# Altium footprint library XU-GENARAL PCB .PcbLib: 1176 footprints (part 52 of 75)
Each footprint in its own frame and in the unit in brackets; x right, y up, seen from the top. Pads: shape width x height; smd on the part's side, far side on the other; paste and mask are expansions set on the pad; w line width, h text height; cw(c..) or ccw(c..) is an arc to the next point about the centre after c.
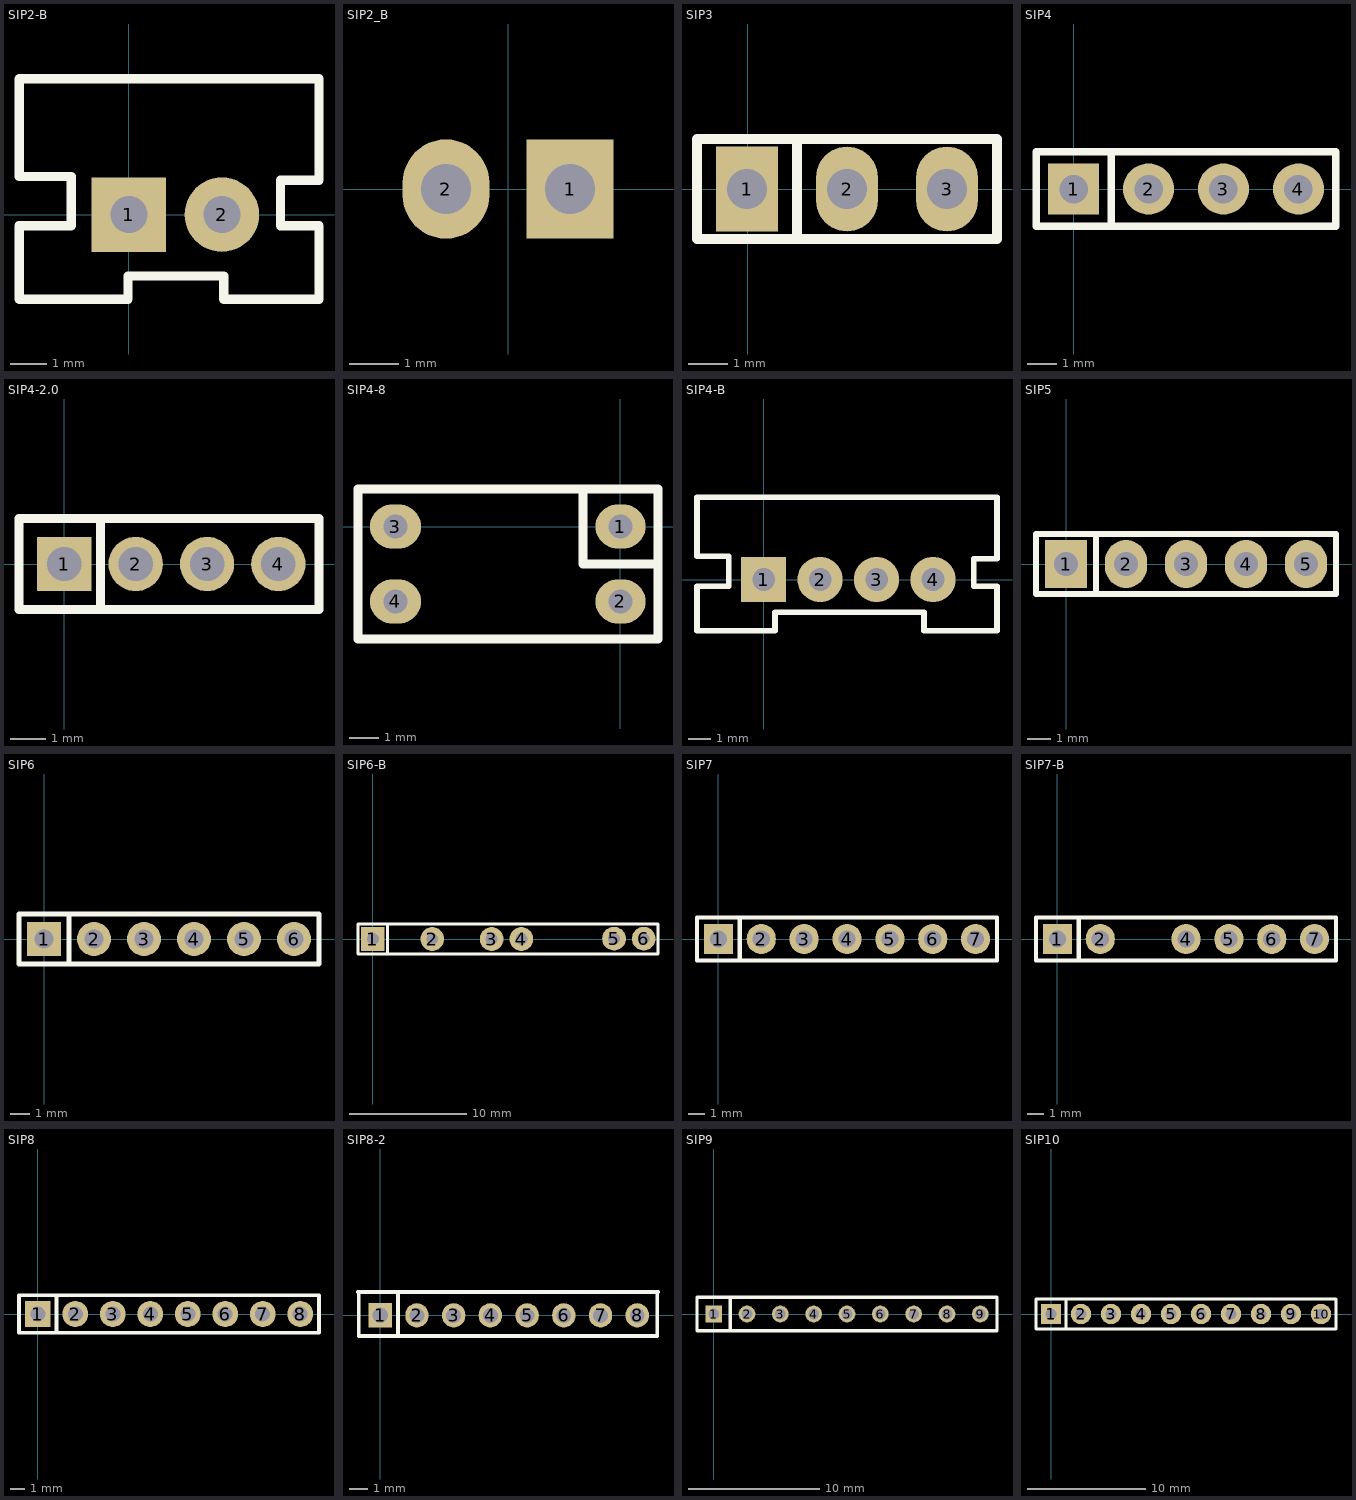
[diagram p51: the footprints below, top view; thin cyan lines are the x and y axes]

## SIP2-B [mil]
pads (2):
  rect 80x80 hole 40: 1(0,0)
  round 80 hole 40: 2(100,0)
Top Overlay:
  lines w10: -118.11,-12 -62,-12 -62,41 ; -118,-12 -118,-91 -1,-91 -1,-66 102,-66 102,-91 204.39,-91 204.39,-12 163,-12 163,37 204.39,37 204.39,146 -118,146 -118,41 -61.89,41

## SIP2_B [mil]
pads (2):
  rect 70x80 hole 40: 1(50,0)
  oval 70x80 hole 40: 2(-50,0)
Bottom Overlay:
  lines w10: -120.87,78.74 -120.87,-78.74 120.87,-78.74 120.87,78.74 -119.96,78.74 ; 0,-78.74 0,78.74

## SIP3 [mil]
pads (3):
  rect 62x85 hole 40: 1(-0.74,0.07)
  oval 62x85 hole 40: 2(99.26,0.07) 3(199.26,0.07)
Top Overlay:
  lines w10: 49.26,-49.92 49.26,50.08 ; -50.74,-49.92 249.26,-49.92 249.26,50.08 -50.74,50.08 -50.74,-49.92

## SIP4 [mil]
pads (4):
  rect 68x68 hole 38: 1(0,0)
  round 68 hole 38: 2(100,0) 3(200,0) 4(300,0)
Top Overlay:
  lines w10: 50,-50 50,50 ; -50,-50 -50,50 350,50 350,-50 -50,-50

## SIP4-2.0 [mil]
pads (4):
  rect 60x60 hole 38: 1(0,0)
  round 60 hole 38: 2(78.74,0) 3(157.48,0) 4(236.22,0)
Top Overlay:
  lines w10: 40,-50 40,50 ; -50,-50 281,-50 281,50 -50,50 -50,-50

## SIP4-8 [mm]
pads (4):
  oval 1.7x1.5 hole 0.8: 1(0,0) 2(0,-2.54)
  oval 1.727x1.5 hole 0.8: 3(-7.62,0) 4(-7.62,-2.54)
Top Overlay:
  lines w0.305: -1.27,1.27 -1.27,-1.27 1.27,-1.27 ; -8.89,-3.81 1.27,-3.81 1.27,1.27 -8.89,1.27 -8.89,-3.81

## SIP4-B [mil]
pads (4):
  rect 80x80 hole 40: 1(0,0)
  round 80 hole 40: 2(100,0) 3(200,0) 4(300,0)
Top Overlay:
  lines w10: -118.11,-12 -62,-12 -62,41 ; -118,-12 -118,-91 20,-91 20,-58 284,-58 284,-91 413.39,-91 413.39,-12 372,-12 372,37 413.39,37 413.39,146 -118,146 -118,41 -61.89,41

## SIP5 [mil]
pads (5):
  rect 70x80 hole 40: 1(0,0)
  oval 70x80 hole 40: 2(100,0) 3(200,0) 4(300,0) 5(400,0)
Top Overlay:
  lines w10: 50,-50 50,50 ; -50,-50 -50,50 450,50 450,-50 -50,-50

## SIP6 [mil]
pads (6):
  rect 68x68 hole 38: 1(0,0)
  round 68 hole 38: 2(100,0) 3(200,0) 4(300,0) 5(400,0) 6(500,0)
Top Overlay:
  lines w10: 50,-50 50,50 ; -50,-50 550,-50 550,50 -50,50 -50,-50

## SIP6-B [mil]
pads (6):
  rect 80x80 hole 40: 1(0,0)
  round 80 hole 40: 2(200,0) 3(400,0) 4(500,0) 5(812,1) 6(912,1)
Top Overlay:
  lines w10: 50,-50 50,50 ; -50,-50 -50,50 960,50 960,-50 -50,-50

## SIP7 [mil]
pads (7):
  rect 68x70 hole 40: 1(0,0)
  oval 68x70 hole 40: 2(100,0) 3(200,0) 4(300,0) 5(400,0) 6(500,0) 7(600,0)
Top Overlay:
  lines w10: 50,-50 50,50 ; -50,-50 -50,50 650,50 650,-50 -50,-50

## SIP7-B [mil]
pads (6):
  rect 68x70 hole 40: 1(0,0)
  oval 68x70 hole 40: 2(100,0) 4(300,0) 5(400,0) 6(500,0) 7(600,0)
Top Overlay:
  lines w10: 50,-50 50,50 ; -50,-50 650,-50 650,50 -50,50 -50,-50

## SIP8 [mil]
pads (8):
  rect 68x70 hole 40: 1(0,0)
  oval 68x70 hole 40: 2(100,0) 3(200,0) 4(300,0) 5(400,0) 6(500,0) 7(600,0) 8(700,0)
Top Overlay:
  lines w10: 50,-50 50,50 ; -50,-50 750,-50 750,50 -50,50 -50,-50

## SIP8-2 [mm]
pads (8):
  rect 1.27x1.324 hole 0.839: 1(0,0)
  oval 1.27x1.324 hole 0.809: 2(2,0) 3(4,0) 4(6,0) 5(8,0) 6(10,0) 7(12,0) 8(14,0)
Top Overlay:
  lines w0.204: -1.21,1.27 13.97,1.27 15.13,1.27 ; -1.17,1.222 -1.17,-1.118 13.97,-1.118 ; 0.965,-1.118 0.965,1.222 ; 13.928,-1.118 15.088,-1.118 15.088,1.219

## SIP9 [mil]
pads (9):
  rect 50x50 hole 32: 1(0,0)
  round 50 hole 32: 2(100,0) 3(200,0) 4(300,0) 5(400,0) 6(500,0) 7(600,0) 8(700,0) 9(800,0)
Top Overlay:
  lines w10: 50,-50 50,50 ; -50,-50 -50,50 850,50 850,-50 -50,-50

## SIP10 [mil]
pads (10):
  rect 68x68 hole 38: 1(0,0)
  round 68 hole 38: 2(100,0) 3(200,0) 4(300,0) 5(400,0) 6(500,0) 7(600,0) 8(700,0) 9(800,0) 10(900,0)
Top Overlay:
  lines w10: 50,-50 50,50 ; -50,-50 950,-50 950,50 -50,50 -50,-50